# Altium footprint library ATM1099C-0627-ssy-1.brd.PcbLib: 48 footprints (part 1 of 3)
Each footprint in its own frame and in the unit in brackets; x right, y up, seen from the top. Pads: shape width x height; smd on the part's side, far side on the other; paste and mask are expansions set on the pad; w line width, h text height; cw(c..) or ccw(c..) is an arc to the next point about the centre after c.
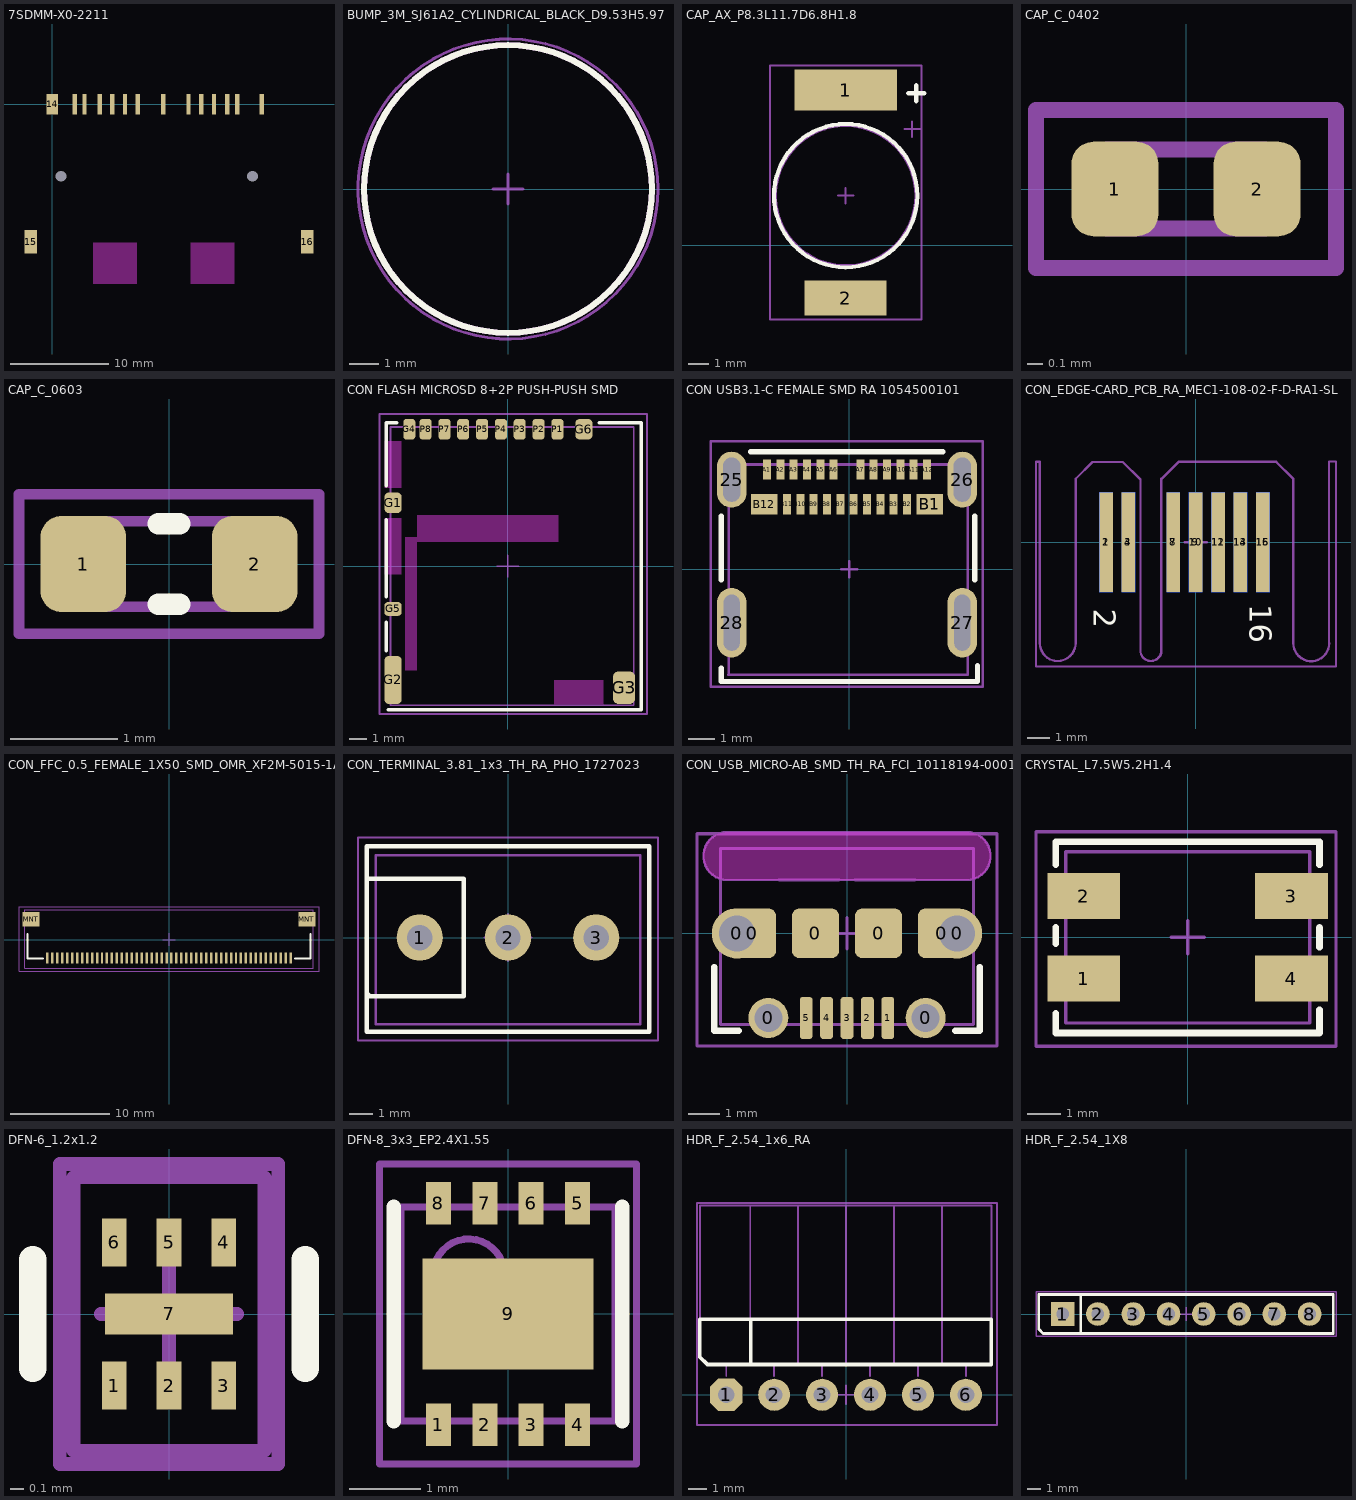
[diagram p0: the footprints below, top view; thin cyan lines are the x and y axes]

## 7SDMM-X0-2211 [mm]
pads (18):
  rect 0.45x2.1 smd: 1(18.93,0) 2(16.55,0) 3(13.95,0) 4(11.35,0) 5(8.75,0) 6(6.15,0) 7(3.3,0) 8(2.3,0) 9(21.43,0) 10(17.93,0) 11(15.25,0) 12(7.45,0) 13(4.85,0)
  rect 1.2x2.1 smd: 14(0,0)
  rect 1.3x2.4 smd: 15(-2.2,-14.05) 16(26.1,-14.05)
  round 0.5 hole 1.1 unplated: A(0.9,-7.35) B(20.5,-7.35)
Top Layer keep-out:
  rectangle: 14.175,-18.35 18.675,-14.15
  rectangle: 4.175,-18.35 8.675,-14.15
3D body: height 4, standoff 1, extent 24.8,-19.3 25.4,-10.6
3D body: height 0.5, standoff 0, extent -0.2,-1.1 0.1,0.4
3D body: height 0.5, standoff 0, extent 2.2,-1.1 2.4,0.4
3D body: height 0.5, standoff 0, extent 3.2,-1.1 3.4,0.4
3D body: height 0.5, standoff 0, extent 4.8,-1.1 4.9,0.4
3D body: height 0.5, standoff 0, extent 6.1,-1.1 6.2,0.4
3D body: height 0.5, standoff 0, extent 7.4,-1.1 7.5,0.4
3D body: height 0.5, standoff 0, extent 8.7,-1.1 8.8,0.4
3D body: height 0.5, standoff 0, extent 11.3,-1.1 11.4,0.4
3D body: height 0.5, standoff 0, extent 13.9,-1.1 14,0.4
3D body: height 0.5, standoff 0, extent 15.2,-1.1 15.3,0.4
3D body: height 0.5, standoff 0, extent 16.5,-1.1 16.6,0.4
3D body: height 0.5, standoff 0, extent 17.9,-1.1 18,0.4
3D body: height 0.5, standoff 0, extent 18.9,-1.1 19,0.4
3D body: height 0.5, standoff 0, extent 21.4,-1.1 21.5,0.4
3D body: height 0.5, standoff 0, extent 25.4,-14.9 26.3,-13.2
3D body: height 0.5, standoff 0, extent -2.6,-15 -1.5,-13.3
3D body: height 4, standoff 1, extent -1.5,-1.8 22.5,-1.1
3D body: height 4, standoff 1, extent -1.5,-19.3 -0.8,-1.1
3D body: height 4.7, standoff 4, extent -1.5,-19.3 25.4,-1.1
3D body: height 1, standoff 0, extent -1.5,-19.3 25.4,-1.1

## BUMP_3M_SJ61A2_CYLINDRICAL_BLACK_D9.53H5.97 [mm] "3M Bumpon Cylindrical D=9.53mm H=5.97mm"
height 5.97
Top Overlay:
  circle w0.203: c0,0 r4.826
Mechanical 11:
  circle w0.203: c0,0 r4.826
  text "Pad" at -1.4,-1.6 h1
  text "Rubber" at -2.5,0.7 h1
Mechanical 15:
  circle w0.102: c0,0 r5.029
  lines w0.1: -0.5,0 0.5,0 ; 0,-0.5 0,0.5
3D body "SJ61A2_BLACK.stp": height 5.97, standoff 0, extent -4.762,-4.762 4.763,4.763

## CAP_AX_P8.3L11.7D6.8H1.8 [mm]
height 1.8
pads (2):
  rect 5x2 smd: 1(15.75,7.575)
  rect 4x1.7 smd: 2(15.75,-2.575)
Top Overlay:
  circle w0.2: c15.75,2.425 r3.5
  lines w0.229: 18.819,7.425 19.581,7.425 ; 19.2,7.044 19.2,7.806
Mechanical 11:
  circle w0.1: c15.75,2.425 r3.4
  lines w0.1: 18.619,5.675 19.381,5.675 ; 19,5.294 19,6.056
  text "'.Designator'" at 16.187,1.279 h1
Mechanical 15:
  lines w0.1: 15.375,2.425 16.125,2.425 ; 15.75,2.05 15.75,2.8 ; 12.05,-3.625 12.05,8.775 19.45,8.775 19.45,-3.625 12.05,-3.625
3D body: height 1.71, standoff 0.01, extent 14.25,-3.225 17.25,2.425
3D body: height 1.55, standoff 0.15, extent 12.35,-0.975 19.15,5.825
3D body: height 0.15, standoff 0, extent 13.75,2.425 17.75,8.075
3D body: height 0.15, standoff 0, extent 13.75,0.425 17.75,4.425
3D body: height 1.7, standoff 1.55, extent 14.262,0.928 17.25,3.922

## CAP_C_0402 [mm] "Chip Capacitor, 2-Leads, Body 1.0x0.5mm, IPC High Density"
height 0.5
pads (2):
  rrect50% 0.55x0.6 smd: 1(-0.45,0) 2(0.45,0)
Mechanical 11:
  lines w0.1: -0.5,-0.25 -0.5,0.25 0.5,0.25 0.5,-0.25 -0.5,-0.25
  text ".Designator" at -0.4,-0.15 h0.3
Mechanical 13:
  lines w0.1: -0.5,-0.25 0.5,-0.25 0.5,0.25 -0.5,0.25 -0.5,-0.25
Mechanical 15:
  lines w0.1: -0.95,-0.5 0.95,-0.5 0.95,0.5 -0.95,0.5 -0.95,-0.5
  text "C" at -0.2,-0.29 h0.6
3D body "CAP_C_0402.step": height 0.2, standoff 0, extent -0.5,-0.3 0.5,0.3

## CAP_C_0603 [mm] "Chip Capacitor, 2-Leads, Body 1.6x0.8mm, IPC Medium Density"
height 0.8
pads (2):
  rrect50% 0.8x0.9 smd: 1(-0.8,0) 2(0.8,0)
Top Overlay:
  lines w0.2: -0.1,-0.375 0.1,-0.375 ; -0.1,0.375 0.1,0.375
Mechanical 11:
  lines w0.1: -0.8,-0.4 -0.8,0.4 0.8,0.4 0.8,-0.4 -0.8,-0.4
  text ".Designator" at 0.475,0.175 h0.35
Mechanical 13:
  lines w0.1: -0.8,-0.4 0.8,-0.4 0.8,0.4 -0.8,0.4 -0.8,-0.4
Mechanical 15:
  lines w0.1: -1.4,-0.65 1.4,-0.65 1.4,0.65 -1.4,0.65 -1.4,-0.65
  text "C" at -0.2,-0.29 h0.6
3D body "CAP_C_0603.step": height 0.3, standoff 0, extent -0.8,-0.4 0.8,0.4

## CON FLASH MICROSD 8+2P PUSH-PUSH SMD [mm]
pads (14):
  rrect50% 1x1.2 smd: G1(-6.705,3.701) G6(4.445,8.001)
  rrect50% 1x2.8 smd: G2(-6.705,-6.649)
  rrect50% 1.3x1.9 smd: G3(6.795,-7.099)
  rrect50% 0.7x1.2 smd: G4(-5.755,8.001) P1(2.895,8.001) P2(1.795,8.001) P3(0.695,8.001) P4(-0.405,8.001) P5(-1.505,8.001) P6(-2.605,8.001) P7(-3.705,8.001) P8(-4.805,8.001)
  rrect50% 1x0.8 smd: G5(-6.705,-2.499)
Top Layer keep-out:
  rectangle: 2.7,-8.075 5.6,-6.65
  rectangle: -6,-6.1 -5.3,1.7
  rectangle: -7.2,-0.5 -6.2,2.82
  rectangle: -7.2,4.57 -6.2,7.32
  rectangle: -5.3,1.4 2.95,3
Top Overlay:
  lines w0.2: -7.112,-4.953 -7.112,-3.275 ; -7.112,-1.778 -7.112,2.7 ; -7.112,4.699 -7.112,8.382 -6.477,8.382 ; -6.985,-8.382 7.62,-8.382 7.747,-8.382 ; 5.334,8.382 7.747,8.382 ; 7.8,-8.382 7.8,8.382
Mechanical 11:
  lines w0.1: -6.858,-8.128 -6.858,8.128 7.366,8.128 7.366,-8.128 7.239,-8.128 -6.858,-8.128
  text "'.Designator'" at -5.461,-0.381 h1
  text "1" at 2.794,7.493 h1
Mechanical 15:
  lines w0.1: -0.635,0 0.635,0 ; 0,-0.635 0,0.635 ; -7.493,-8.636 8.128,-8.636 8.128,8.89 -7.493,8.89 -7.493,-8.636
3D body "User Library-Micro_SD.step": height 1.6, standoff 0.63, extent -5.5,-9.405 5.5,5.595
3D body "DM3AT-SF-PEJM5.stp": height 1.68, standoff 0, extent -6.798,-7.895 7.052,8.255

## CON USB3.1-C FEMALE SMD RA 1054500101 [mm]
height 3.24
pads (28):
  oval 1.1x2.1 / inner oval 1.1x2.1 / far side oval 1.2x2.3 hole 0.65 slot 1.65 at 90 deg: 25(-4.41,3.36) 26(4.23,3.36)
  oval 1.1x2.6 / inner oval 1.1x2.6 / far side oval 1.2x2.8 hole 0.6 slot 2.1 at 90 deg: 27(4.23,-2) 28(-4.41,-2)
  rect 0.3x0.76 smd: A1(-3.09,3.74) A2(-2.59,3.74) A3(-2.09,3.74) A4(-1.59,3.74) A5(-1.09,3.74) A6(-0.59,3.74) A7(0.41,3.74) A8(0.91,3.74) A9(1.41,3.74) A10(1.91,3.74) A11(2.41,3.74) A12(2.91,3.74) B2(2.16,2.44) B3(1.66,2.44) B4(1.16,2.44) B5(0.66,2.44) B6(0.16,2.44) B7(-0.34,2.44) B8(-0.84,2.44) B9(-1.34,2.44) B10(-1.84,2.44) B11(-2.34,2.44)
  rect 1x0.76 smd: B1(3.01,2.44) B12(-3.19,2.44)
Top Overlay:
  lines w0.2: -4.8,-3.7 -4.8,-4.2 4.8,-4.2 4.8,-3.6 ; -4.8,-0.4 -4.8,2 ; -3.7,4.4 3.5,4.4 ; 4.7,-0.4 4.7,2
Mechanical 11:
  lines w0.1: -4.61,3.88 -4.56,3.93 4.51,3.93 4.43,3.85 4.43,-3.94 4.42,-3.95 -4.53,-3.95 -4.52,-3.94 -4.52,3.88
  text "'.Designator'" at -5.58,-0.14 h1
  text "A1" at -3.7,3.7 h1
Mechanical 15:
  lines w0.1: -0.3,0 0.3,0 ; 0,-0.3 0,0.3 ; -5.2,-4.4 -5.2,4.4 -5.2,4.8 5,4.8 5,-4.4 -5.2,-4.4
3D body "1054500101.stp": height 3.08, standoff -0.88, extent -4.57,-4 4.37,3.9

## CON_EDGE-CARD_PCB_RA_MEC1-108-02-F-D-RA1-SL [mm] "MEC1-108-02-F-D-RA1-SL connector matching PCB pads"
pads (14):
  rect 0.6x4.45 smd far side: 1(-4,0) 3(-3,0) 7(-1,0) 9(0,0) 11(1,0) 13(2,0) 15(3,0)
  rect 0.6x4.45 smd: 2(-4,0) 4(-3,0) 8(-1,0) 10(0,0) 12(1,0) 14(2,0) 16(3,0)
Top Overlay:
  text "16" at 2.41,-2.775 h1
  text "2" at -4.56,-2.965 h1
Bottom Overlay:
  text "15" at 3.472,-2.748 h1
  text "1" at -3.649,-3.018 h1
Mechanical 2:
  lines w0.1: -6.96,3.585 -6.96,-4.505 ccw(c-6.16,-4.505) -5.36,-4.505 ; -5.36,-4.509 -5.36,2.831 -4.606,3.585 -3.25,3.585 -2.467,2.802 -2.467,-3.69 ; -2.467,-3.689 -2.467,-4.837 ccw(c-2,-4.839) -1.533,-4.838 -1.533,-3.577 ; -1.533,-3.653 -1.533,2.834 ; -1.5,2.834 -0.749,3.585 3.601,3.585 4.36,2.826 4.36,-4.505 ; 4.36,-4.516 ccw(c5.16,-4.516) 5.96,-4.516 ; 5.96,-4.505 5.96,3.585
Mechanical 11:
  text "2" at -4.4,-0.95 h1
  text "'.Designator'" at -0.8,-0.775 h1
Mechanical 15:
  lines w0.1: -7.129,3.597 -7.129,-5.548 6.267,-5.548 6.267,3.6 5.96,3.6 5.96,-4.132 5.96,-4.521 5.961,-4.523 ; -6.97,3.593 -7.126,3.593 -7.126,3.587 -6.96,3.587 -6.96,-4.485 ccw(c-6.108,-4.485) -6.71,-5.088 -6.709,-5.089 ccw(c-6.195,-4.575) -6.195,-5.302 -6.188,-5.302 -6.15,-5.302 ccw(c-6.15,-4.517) -5.595,-5.072 ccw(c-6.167,-4.5) -5.358,-4.5 -5.358,-4.308 -5.358,2.833 ; -5.36,2.828 -5.36,2.831 -4.608,3.583 -3.261,3.583 -3.259,3.585 -3.252,3.585 -2.467,2.8 -2.467,-4.823 -2.467,-4.843 ccw(c-2.023,-4.843) -2.337,-5.157 -2.315,-5.179 ccw(c-2.015,-4.878) -2.015,-5.303 ; -2.001,-5.303 ccw(c-2.001,-4.83) -1.666,-5.164 -1.61,-5.108 ccw(c-1.803,-4.915) -1.53,-4.915 -1.53,-4.546 cw(c-1.53,-4.543) -1.533,-4.543 -1.533,2.835 -0.761,3.597 3.596,3.595 4.355,2.842 4.353,-4.548 ; -0.5,0 0.5,0 ; 0,-0.5 0,0.5 ; 4.364,-4.507 ccw(c5.164,-4.507) 5.964,-4.507

## CON_FFC_0.5_FEMALE_1X50_SMD_OMR_XF2M-5015-1A [mm] "CONN FFC TOP/BOTTOM 50POS 0.50MM R/A"
height 2.1
pads (52):
  rect 0.25x1.1 smd: 1(-12.25,-1.841) 2(-11.75,-1.841) 3(-11.25,-1.841) 4(-10.75,-1.841) 5(-10.25,-1.841) 6(-9.75,-1.841) 7(-9.25,-1.841) 8(-8.75,-1.841) 9(-8.25,-1.841) 10(-7.75,-1.841) 11(-7.25,-1.841) 12(-6.75,-1.841) 13(-6.25,-1.841) 14(-5.75,-1.841) 15(-5.25,-1.841) 16(-4.75,-1.841) 17(-4.25,-1.841) 18(-3.75,-1.841) 19(-3.25,-1.841) 20(-2.75,-1.841) 21(-2.25,-1.841) 22(-1.75,-1.841) 23(-1.25,-1.841) 24(-0.75,-1.841) 25(-0.25,-1.841) 26(0.25,-1.841) 27(0.75,-1.841) 28(1.25,-1.841) 29(1.75,-1.841) 30(2.25,-1.841) 31(2.75,-1.841) 32(3.25,-1.841) 33(3.75,-1.841) 34(4.25,-1.841) 35(4.75,-1.841) 36(5.25,-1.841) 37(5.75,-1.841) 38(6.25,-1.841) 39(6.75,-1.841) 40(7.25,-1.841) 41(7.75,-1.841) 42(8.25,-1.841) 43(8.75,-1.841) 44(9.25,-1.841) 45(9.75,-1.841) 46(10.25,-1.841) 47(10.75,-1.841) 48(11.25,-1.841) 49(11.75,-1.841) 50(12.25,-1.841)
  rect 1.7x1.5 smd: MNT(-13.9,2.059) MNT(13.9,2.059)
Top Overlay:
  lines w0.2: -14.25,0.559 -14.25,-1.891 -12.675,-1.891 ; 12.7,-1.891 14.25,-1.891 14.25,0.559
  text "." at -12.446,-3.302 h2
Mechanical 11:
  lines w0.1: -14.55,-2.9 14.55,-2.9 14.55,3 -14.55,3 -14.55,-2.9
  text ".Designator" at -0.889,0.714 h1
Mechanical 15:
  lines w0.1: -0.635,0 0.635,0 ; 0,-0.635 0,0.635 ; -15.113,-3.175 15.113,-3.175 15.113,3.302 -15.113,3.302 -15.113,-3.175
3D body "XF2M_5015_1A.step": height 2, standoff 0, extent -14.55,-2.9 14.55,3

## CON_TERMINAL_3.81_1x3_TH_RA_PHO_1727023 [mm]
pads (3):
  round 2 hole 1.1: 1(-3.81,0) 2(0,0) 3(3.81,0)
Top Overlay:
  lines w0.2: -6.096,-2.413 -5.969,-2.54 -1.905,-2.54 -1.905,2.54 -5.969,2.54 ; -6.096,-4.064 -6.096,3.937 6.096,3.937 6.096,-4.064 -6.096,-4.064
Mechanical 11:
  lines w0.1: -5.715,-3.744 -5.715,3.556 5.715,3.556 5.715,-3.744 -5.715,-3.744
  text "'.Designator'" at 1.275,0.375 h1
  text "1" at -4.953,0.889 h1
Mechanical 15:
  lines w0.1: -1.016,0 1.016,0 ; 0,-1.016 0,1.016 ; 0,-0.381 0,0.254 ; -6.477,-4.445 -6.477,4.318 -6.35,4.318 6.477,4.318 6.477,-4.445 -6.477,-4.445
3D body "1727023_02.stp": height 8.5, standoff -3.5, extent -5.715,-3.744 5.715,3.556

## CON_USB_MICRO-AB_SMD_TH_RA_FCI_10118194-0001LF [mil] "FCI USB Micro-AB SMD RA L5W8.8H2.8"
height 110.24
pads (13):
  round 63 hole 45: 0(-138,0) 0(138,0)
  rrect30% 59x62 smd paste-2: 0(-118.5,0) 0(-39.5,0) 0(39.5,0) 0(118.5,0)
  round 50 hole 35: 0(-98.5,-106)
  rrect100% 50x50 hole 35: 0(98.5,-106)
  rrect50% 16x53 smd paste-1.8 mask+3: 1(51.18,-106) 2(25.59,-106) 3(0,-106) 4(-25.59,-106) 5(-51.18,-106)
Top Overlay:
  lines w7.87: -166.34,-42 -166.34,-122.05 -135.83,-122.05 ; 135.83,-122.05 166.34,-122.05 166.34,-42
Keep-Out Layer:
  board cut-out: 150,67 152.95,67 158.75,68.15 164.21,70.41 169.12,73.7 173.3,77.88 176.59,82.79 178.85,88.25 180,94.05 180,97 180,99.95 178.85,105.75 176.59,111.21 173.3,116.12 169.12,120.3 164.21,123.59 158.75,125.85 152.95,127 150,127 -150,127 -152.95,127 -158.75,125.85 -164.21,123.59 -169.12,120.3 -173.3,116.12 -176.59,111.21 -178.85,105.75 -180,99.95 -180,97 -180,94.05 -178.85,88.25 -176.59,82.79 -173.3,77.88 -169.12,73.7 -164.21,70.41 -158.75,68.15 -152.95,67 -150,67
  board cut-out: 150,67 152.95,67 158.75,68.15 164.21,70.41 169.12,73.7 173.3,77.88 176.59,82.79 178.85,88.25 180,94.05 180,97 180,99.95 178.85,105.75 176.59,111.21 173.3,116.12 169.12,120.3 164.21,123.59 158.75,125.85 152.95,127 150,127 -150,127 -152.95,127 -158.75,125.85 -164.21,123.59 -169.12,120.3 -173.3,116.12 -176.59,111.21 -178.85,105.75 -180,99.95 -180,97 -180,94.05 -178.85,88.25 -176.59,82.79 -173.3,77.88 -169.12,73.7 -164.21,70.41 -158.75,68.15 -152.95,67 -150,67
Mechanical 11:
  lines w3.94: -158.46,-114.17 158.46,-114.17 158.46,106.3 -158.46,106.3 -158.46,-114.17
  lines w4: -85,67 -10,67 ; 10,67 85,67
  text "PCB EDGE" at -112,79 h30
  text ".Designator" at -204.72,-19.68 h39.37
Mechanical 15:
  lines w3.94: -19.68,0 19.68,0 ; 0,-19.68 0,19.68
  lines w4: -188,-141 -188,125 188,125 188,-141 -188,-141
Mechanical 16:
  lines w3: -150,67 cw(c-150,97) -150,127 150,127 cw(c150,97) 150,67 -150,67
3D body "User Library-10118194.step": height 108.03, standoff -20.91, extent -158.46,-113.68 158.46,106

## CRYSTAL_L7.5W5.2H1.4 [mm] "SMD7X5"
height 1.4
pads (4):
  rect 2.2x1.4 smd: 1(-3.15,-1.25) 2(-3.15,1.25) 3(3.15,1.25) 4(3.15,-1.25)
Top Overlay:
  lines w0.2: -4,-2.3 -4,-2.9 4,-2.9 4,-2.2 ; -4,-0.2 -4,0.3 ; -4,2.2 -4,2.9 4,2.9 4,2.2 ; 4,-0.3 4,0.3
  text "." at -4.6,-2.6 h1
Mechanical 11:
  lines w0.1: -3.7,-2.6 3.7,-2.6 3.7,2.6 -3.7,2.6 -3.7,-2.6
  text "1" at -3.2,-1.8 h1
  text "'.Designator'" at -2.225,1.225 h1
Mechanical 15:
  lines w0.1: -0.5,0 0.5,0 ; 0,-0.5 0,0.5 ; -4.6,-3.3 -4.6,3.2 -4.5,3.2 4.5,3.2 4.5,-3.3 -4.6,-3.3
3D body: height 0.5, standoff 0, extent -3.7,-2.6 3.7,2.6
3D body: height 1.45, standoff 1.4, extent -3.096,-1.999 -2.1,-1.001
3D body: height 1.4, standoff 0.6, extent -3.3,-2.2 3.3,2.2
3D body: height 0.6, standoff 0.5, extent -3.5,-2.4 3.5,2.4

## DFN-6_1.2x1.2 [mm] "DFN, 6-Leads, Body 1.2x1.2mm (max), Pitch 0.65"
height 0.4
pads (7):
  rect 0.18x0.35 smd: 1(-0.4,-0.525) 2(0,-0.525) 3(0.4,-0.525) 4(0.4,0.525) 5(0,0.525) 6(-0.4,0.525)
  rect 0.94x0.3 smd: 7(0,0)
Top Overlay:
  lines w0.2: -1,-0.4 -1,0.4 ; 1,-0.4 1,0.4
  text "." at -0.7,-1.375 h0.8
Mechanical 11:
  lines w0.1: -0.7,-1.002 0.7,-1.002 0.7,1.002 -0.7,1.002 -0.7,-1.002
  text ".Designator" at -0.4,-0.3 h0.5
  text "1" at -0.9,-1.2 h0.5
Mechanical 15:
  lines w0.1: -0.5,0 0.5,0 ; 0,-0.5 0,0.5 ; -0.8,-1.1 -0.8,1.1 0.8,1.1 0.8,-1.1 -0.8,-1.1
3D body "mic5528.stp": height 0.6, standoff 0, extent -0.625,-0.625 0.625,0.625

## DFN-8_3x3_EP2.4X1.55 [mm] "DFN, 8-Leads, Body 3.0x3.0mm (max), Pitch 0.65mm, IPC Medium Density"
height 0.9
pads (9):
  rect 0.35x0.6 smd: 1(-0.975,-1.55) 2(-0.325,-1.55) 3(0.325,-1.55) 4(0.975,-1.55) 5(0.975,1.55) 6(0.325,1.55) 7(-0.325,1.55) 8(-0.975,1.55)
  rect 2.4x1.55 smd: 9(0,0)
Top Overlay:
  lines w0.2: -1.6,-1.5 -1.6,1.5 ; 1.6,-1.5 1.6,1.5
  text "." at -1.75,-2.075 h1
Mechanical 11:
  lines w0.1: -1.5,-1.5 -1.5,1.5 1.5,1.5 1.5,-1.5 -1.5,-1.5
  text ".Designator" at 0.225,-0.875 h0.6
  text "1" at -1.3,-1.3 h0.6
Mechanical 13:
  circle w0.1: c-0.55,0.55 r0.5
  lines w0.1: -1.5,-1.5 1.5,-1.5 1.5,1.5 -1.5,1.5 -1.5,-1.5
Mechanical 15:
  lines w0.1: -0.5,0 0.5,0 ; 0,-0.5 0,0.5 ; -1.8,-2.1 1.8,-2.1 1.8,2.1 -1.8,2.1 -1.8,-2.1
3D body: height 0.6, standoff 0.05, extent -1.5,-1.5 1.5,1.5
3D body: height 0.61, standoff 0.6, extent -1.396,-1.399 -0.599,-0.6

## HDR_F_2.54_1x6_RA [mm] "Header Female Right Angle 6 Way 2.54mm Pitch"
pads (6):
  oct 1.7x1.7 hole 0.9: 1(-6.35,0)
  round 1.7 hole 0.9: 2(-3.81,0) 3(-1.27,0) 4(1.27,0) 5(3.81,0) 6(6.35,0)
Top Overlay:
  lines w0.2: -5.05,1.6 -5.05,4 ; -7.75,2 -7.35,1.6 7.7,1.6 7.7,4 -7.75,4 -7.75,2
Mechanical 11:
  lines w0.1: -6.35,1 -6.35,1.6 ; -5.08,1.6 -5.08,10.033 ; -3.81,1 -3.81,1.6 ; -2.54,1.6 -2.54,10.033 ; -1.27,1 -1.27,1.6 ; 0,1.6 0,10.033 ; 1.27,1 1.27,1.6 ; 2.54,1.6 2.54,10.033 ; 3.81,1 3.81,1.6 ; 5.08,1.6 5.08,10.033 ; 6.35,1 6.35,1.6 ; -7.75,2 -7.75,10.033 7.7,10.033 7.7,1.6 -7.35,1.6 -7.75,2
  text ".Designator" at -6.05,2.5 h1
Mechanical 15:
  lines w0.1: -0.5,0 0.5,0 ; 0,-0.5 0,0.5 ; -7.9,-1.6 8,-1.6 8,10.16 -7.9,10.16 -7.9,-1.6
3D body "HDR_F_254_1x6 RA.step": height 2.46, standoff -2.5, extent -7.874,-0.203 7.874,10.033

## HDR_F_2.54_1X8 [mm] "Header Female Vertical 8 Way 2.54mm Pitch"
pads (8):
  rect 1.7x1.7 hole 0.9: 1(-8.89,0)
  round 1.7 hole 0.9: 2(-6.35,0) 3(-3.81,0) 4(-1.27,0) 5(1.27,0) 6(3.81,0) 7(6.35,0) 8(8.89,0)
Top Overlay:
  lines w0.2: -7.59,-1.4 -7.59,1.4 ; -10.61,-1.09 -10.3,-1.4 10.59,-1.4 10.59,1.4 -10.61,1.4 -10.61,-1.09
Mechanical 11:
  lines w0.1: -7.59,-1.4 -7.59,1.4 ; -10.61,-1.09 -10.61,1.4 10.59,1.4 10.59,-1.4 -10.3,-1.4 -10.61,-1.09
  text ".Designator" at -1.7,-0.5 h1
Mechanical 15:
  lines w0.1: -0.5,0 0.5,0 ; 0,-0.5 0,0.5 ; -10.81,-1.6 10.79,-1.6 10.79,1.6 -10.81,1.6 -10.81,-1.6
3D body "HDR_F_254_1x8.step": height 8.51, standoff -2.64, extent -10.41,-1.207 10.418,1.207